# Altium footprint library 430 integreted.PcbLib: 281 footprints (part 6 of 18)
Each footprint in its own frame and in the unit in brackets; x right, y up, seen from the top. Pads: shape width x height; smd on the part's side, far side on the other; paste and mask are expansions set on the pad; w line width, h text height; cw(c..) or ccw(c..) is an arc to the next point about the centre after c.
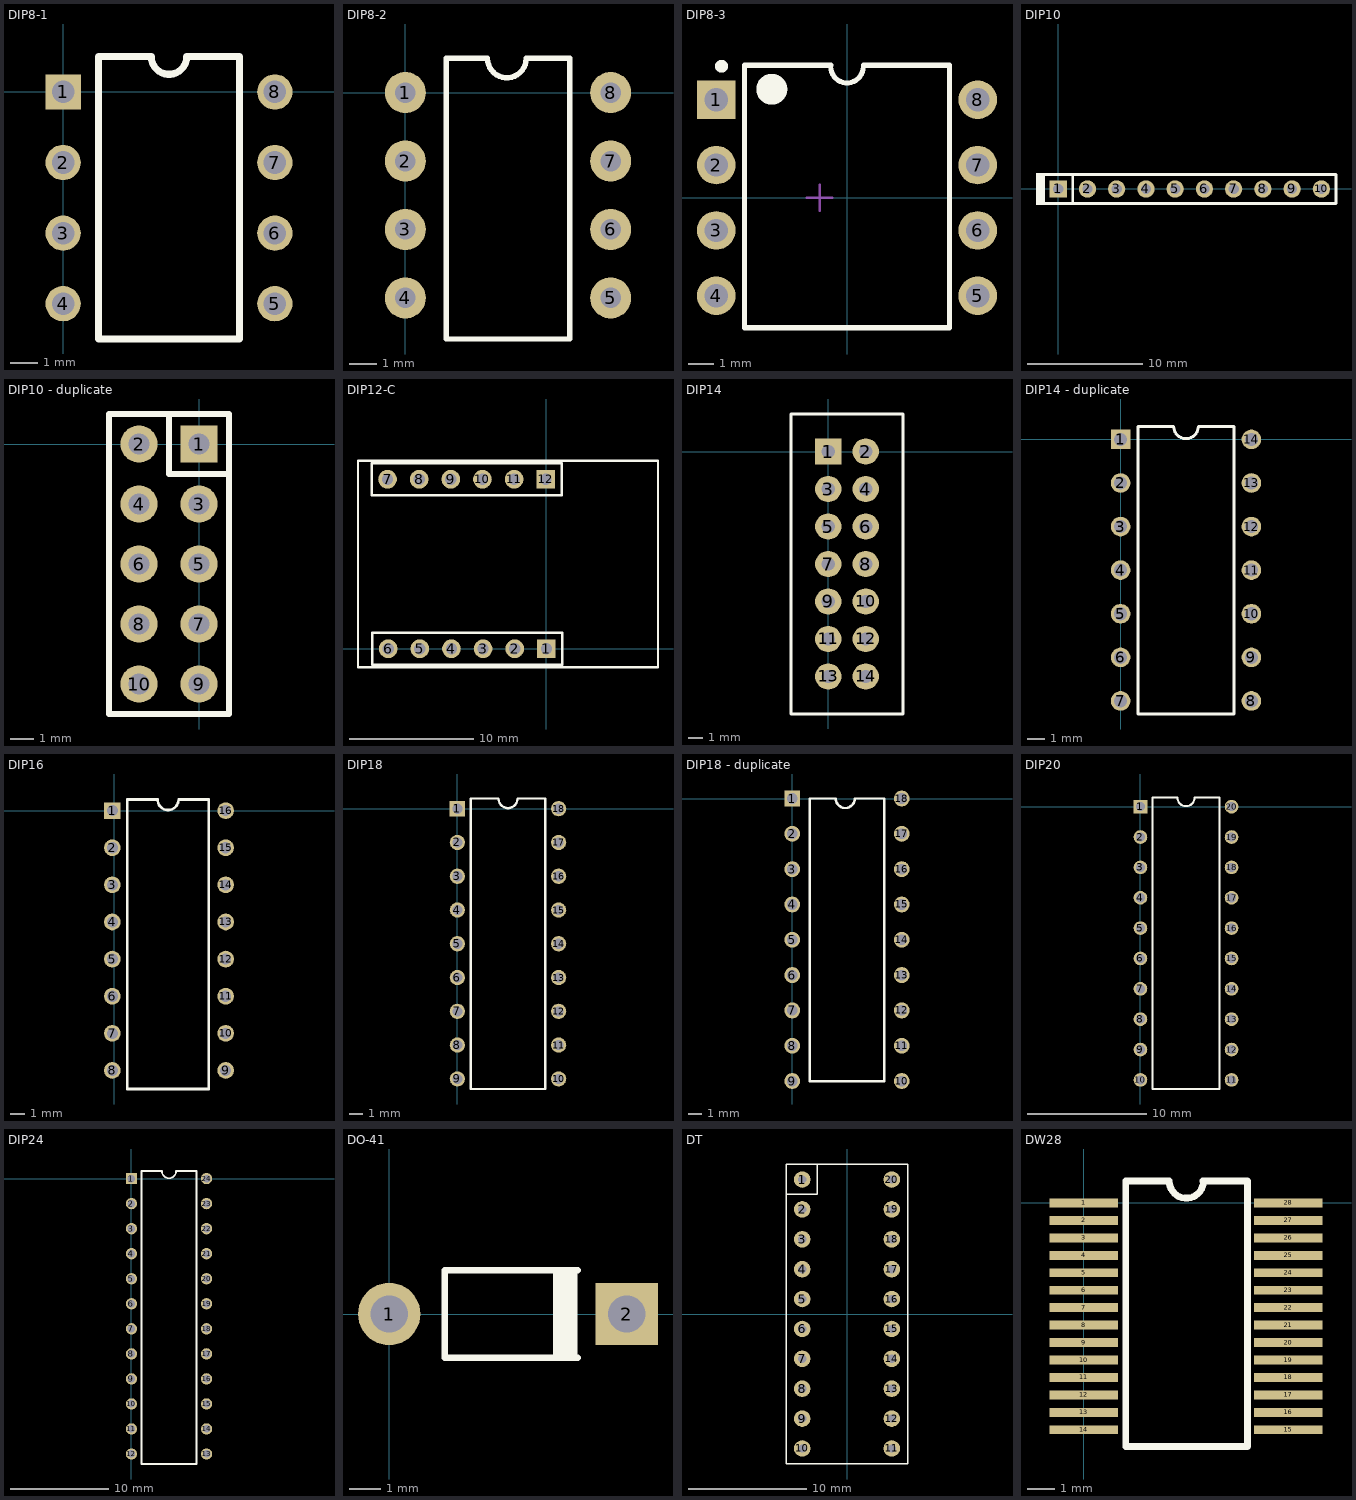
[diagram p5: the footprints below, top view; thin cyan lines are the x and y axes]

## DIP8-1 [mil]
pads (8):
  rect 50x50 hole 32: 1(0,0)
  round 50 hole 32: 2(0,-100) 3(0,-200) 4(0,-300) 5(300,-300) 6(300,-200) 7(300,-100) 8(300,0)
Top Overlay:
  lines w10: 50,-350 250,-350 250,50 175,50 cw(c150,50) 125,50 50,50 50,-350

## DIP8-2 [mil]
pads (8):
  round 60 hole 30: 1(0,0) 2(0,-100) 3(0,-200) 4(0,-300) 5(300,-300) 6(300,-200) 7(300,-100) 8(300,0)
Top Overlay:
  lines w8: 60,-360 60,50 120,50 ccw(c148.28,50) 176.57,50 240,50 240,-360 60,-360

## DIP8-3 [mm]
pads (8):
  rect 1.5x1.5 hole 0.9: 1(-5.08,3.81)
  round 1.5 hole 0.9: 2(-5.08,1.27) 3(-5.08,-1.27) 4(-5.08,-3.81) 5(5.08,-3.81) 6(5.08,-1.27) 7(5.08,1.27) 8(5.08,3.81)
Top Overlay:
  circle w0.25: c-4.877,5.11 r0.125
  circle w0.6: c-2.921,4.216 r0.3
  lines w0.2: -0.635,5.099 ccw(c0,5.099) 0.635,5.099 ; -0.632,5.15 -3.988,5.15 -3.988,-5.055 3.988,-5.055 3.988,5.15 0.636,5.15
Mechanical 15:
  lines w0.1: -1.567,0 -0.567,0 ; -1.067,-0.5 -1.067,0.5
3D body: height 4.57, standoff -3.81, extent -3.9,-4.981 3.92,4.929

## DIP10 [mm]
pads (10):
  rect 1.5x1.5 hole 0.889: 1(0,0)
  round 1.5 hole 0.889: 2(2.54,0) 3(5.08,0) 4(7.62,0) 5(10.16,0) 6(12.7,0) 7(15.24,0) 8(17.78,0) 9(20.32,0) 10(22.86,0)
Top Overlay:
  rectangle: -1.925,-1.4 -1.15,1.4
  lines w0.203: 24.13,-1.27 24.13,1.27
  lines w0.254: 1.27,-1.27 1.27,1.27 ; -1.27,1.27 -1.27,-1.27 24.13,-1.27 24.13,1.27 ; -1.27,1.27 24.13,1.27 ; -1.27,1.27 24.13,1.27 ; -1.27,1.27 24.13,1.27

## DIP10 - duplicate [mil]
pads (10):
  rect 62x62 hole 35: 1(0,0)
  round 62 hole 35: 2(-100,0) 3(0,-100) 4(-100,-100) 5(0,-200) 6(-100,-200) 7(0,-300) 8(-100,-300) 9(0,-400) 10(-100,-400)
Top Overlay:
  lines w10: -50,50 -50,-50 50,-50 ; -150,-450 -150,50 50,50 50,-450 -150,-450

## DIP12-C [mm]
pads (12):
  rect 1.5x1.5 hole 0.9: 1(0,0) 12(-0.05,13.61)
  round 1.5 hole 0.9: 2(-2.54,0) 3(-5.08,0) 4(-7.62,0) 5(-10.16,0) 6(-12.7,0) 7(-12.75,13.61) 8(-10.21,13.61) 9(-7.67,13.61) 10(-5.13,13.61) 11(-2.59,13.61)
Top Overlay:
  lines w0.2: -15.12,-1.49 8.96,-1.49 8.96,15.1 -15.12,15.1 -15.12,-1.49 ; -14.02,12.34 1.22,12.34 1.22,14.88 -14.02,14.88 -14.02,12.34 ; -13.97,-1.27 1.27,-1.27 1.27,1.27 -13.97,1.27 -13.97,-1.27

## DIP14 [mil]
pads (14):
  rect 70x70 hole 35: 1(0,0)
  round 70 hole 35: 2(100,0) 3(0,-100) 4(100,-100) 5(0,-200) 6(100,-200) 7(0,-300) 8(100,-300) 9(0,-400) 10(100,-400) 11(0,-500) 12(100,-500) 13(0,-600) 14(100,-600)
Top Overlay:
  lines w8: -100,-700 -100,100 200,100 200,-700 -100,-700

## DIP14 - duplicate [mil]
pads (14):
  rect 45x45 hole 30: 1(0,0)
  round 45 hole 30: 2(0,-100) 3(0,-200) 4(0,-300) 5(0,-400) 6(0,-500) 7(0,-600) 8(300,-600) 9(300,-500) 10(300,-400) 11(300,-300) 12(300,-200) 13(300,-100) 14(300,0)
Top Overlay:
  lines w7: 120,30 70,30 40,30 40,0 40,-630 260,-630 260,30 180,30 ; 121.72,30 ccw(c150,30) 178.28,30

## DIP16 [mil]
pads (16):
  rect 45x45 hole 30: 1(-5,0)
  round 45 hole 30: 2(-5,-100) 3(-5,-200) 4(-5,-300) 5(-5,-400) 6(-5,-500) 7(-5,-600) 8(-5,-700) 9(300,-700) 10(300,-600) 11(300,-500) 12(300,-400) 13(300,-300) 14(300,-200) 15(300,-100) 16(300,0)
Top Overlay:
  lines w7: 115,30 65,30 35,30 35,0 35,-750 255,-750 255,30 175,30 ; 116.72,30 ccw(c145,30) 173.28,30

## DIP18 [mil]
pads (18):
  rect 45x45 hole 30: 1(0,0)
  round 45 hole 30: 2(0,-100) 3(0,-200) 4(0,-300) 5(0,-400) 6(0,-500) 7(0,-600) 8(0,-700) 9(0,-800) 10(300,-800) 11(300,-700) 12(300,-600) 13(300,-500) 14(300,-400) 15(300,-300) 16(300,-200) 17(300,-100) 18(300,0)
Top Overlay:
  lines w7: 120,30 70,30 40,30 40,0 40,-830 260,-830 260,30 180,30 ; 121.72,30 ccw(c150,30) 178.28,30

## DIP18 - duplicate [mil] "PT2262"
pads (18):
  rect 45x45 hole 30: 1(0,0)
  round 45 hole 30: 2(0,-100) 3(0,-200) 4(0,-300) 5(0,-400) 6(0,-500) 7(0,-600) 8(0,-700) 9(0,-800) 10(310,-800) 11(310,-700) 12(310,-600) 13(310,-500) 14(310,-400) 15(310,-300) 16(310,-200) 17(310,-100) 18(310,0)
Top Overlay:
  lines w7: 50,-800 50,0 123.07,0 ccw(c150,0) 176.93,0 260,0 260,-800 50,-800

## DIP20 [mil]
pads (20):
  rect 45x45 hole 30: 1(0,0)
  round 45 hole 30: 2(0,-100) 3(0,-200) 4(0,-300) 5(0,-400) 6(0,-500) 7(0,-600) 8(0,-700) 9(0,-800) 10(0,-900) 11(300,-900) 12(300,-800) 13(300,-700) 14(300,-600) 15(300,-500) 16(300,-400) 17(300,-300) 18(300,-200) 19(300,-100) 20(300,0)
Top Overlay:
  lines w7: 120,30 70,30 40,30 40,0 40,-930 260,-930 260,30 180,30 ; 121.72,30 ccw(c150,30) 178.28,30

## DIP24 [mil]
pads (24):
  rect 45x45 hole 30: 1(0,0)
  round 45 hole 30: 2(0,-100) 3(0,-200) 4(0,-300) 5(0,-400) 6(0,-500) 7(0,-600) 8(0,-700) 9(0,-800) 10(0,-900) 11(0,-1000) 12(0,-1100) 13(300,-1100) 14(300,-1000) 15(300,-900) 16(300,-800) 17(300,-700) 18(300,-600) 19(300,-500) 20(300,-400) 21(300,-300) 22(300,-200) 23(300,-100) 24(300,0)
Top Overlay:
  lines w7: 120,30 70,30 40,30 40,0 40,-1140 260,-1140 260,30 180,30 ; 121.72,30 ccw(c150,30) 178.28,30

## DO-41 [mm]
pads (2):
  round 2 hole 1.2: 1(0,0)
  rect 2x2 hole 1.2: 2(7.62,0)
Top Overlay:
  rectangle: 5.245,-1.4 6.045,1.4
  lines w0.2: 6.045,-1.4 1.778,-1.4 1.778,-0.446 1.778,0.954 1.778,1.4 6.045,1.4

## DT [mm]
pads (20):
  round 1.4 hole 0.7: 1(-3.81,11.43) 2(-3.81,8.89) 3(-3.81,6.35) 4(-3.81,3.81) 5(-3.81,1.27) 6(-3.81,-1.27) 7(-3.81,-3.81) 8(-3.81,-6.35) 9(-3.81,-8.89) 10(-3.81,-11.43) 11(3.81,-11.43) 12(3.81,-8.89) 13(3.81,-6.35) 14(3.81,-3.81) 15(3.81,-1.27) 16(3.81,1.27) 17(3.81,3.81) 18(3.81,6.35) 19(3.81,8.89) 20(3.81,11.43)
Top Overlay:
  lines w0.127: -5.15,10.16 -2.54,10.16 -2.54,12.7 ; -5.15,-12.75 5.15,-12.75 5.15,12.75 -5.15,12.75 -5.15,-12.75

## DW28 [mil]
pads (28):
  rect 100x13 smd: 1(0,0) 2(0,-25.5) 3(0,-51) 4(0,-76.5) 5(0,-102) 6(0,-127.5) 7(0,-153) 8(0,-178.5) 9(0,-204) 10(0,-229.5) 11(0,-255) 12(0,-280.5) 13(0,-306) 14(0,-331.5) 15(299,-331.5) 16(299,-306) 17(299,-280.5) 18(299,-255) 19(299,-229.5) 20(299,-204) 21(299,-178.5) 22(299,-153) 23(299,-127.5) 24(299,-102) 25(299,-76.5) 26(299,-51) 27(299,-25.5) 28(299,0)
Top Overlay:
  lines w10: 61.5,-356 239,-356 ; 61.5,-355.78 61.5,32 124,32 ; 125,32 ccw(c150,32) 175,32 ; 174,32 239.5,32 239.5,-355.78